# Altium footprint library lib_ic_FOOTPRINTS.PcbLib: 98 footprints (part 7 of 7)
Each footprint in its own frame and in the unit in brackets; x right, y up, seen from the top. Pads: shape width x height; smd on the part's side, far side on the other; paste and mask are expansions set on the pad; w line width, h text height; cw(c..) or ccw(c..) is an arc to the next point about the centre after c.
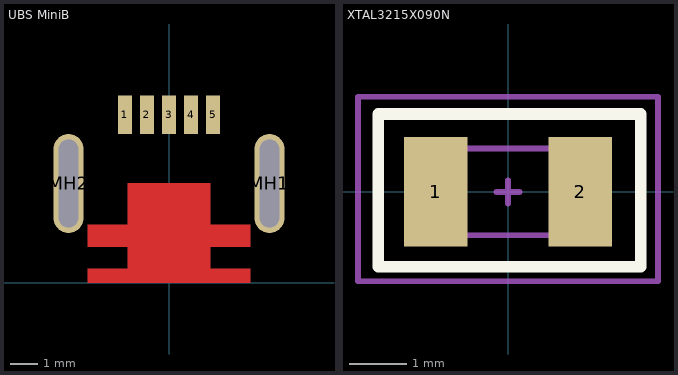
[diagram p6: the footprints below, top view; thin cyan lines are the x and y axes]

## UBS MiniB [mm]
pads (7):
  rect 0.5x1.4 smd: 1(-1.6,6.1) 2(-0.8,6.1) 3(0,6.1) 4(0.8,6.1) 5(1.6,6.1)
  rrect100% 1.1x3.6 hole 0.7 slot 3.2 at 90 deg: MH1(3.65,3.6) MH2(-3.65,3.6)
Top Layer:
  pour cut-out: -1.5,0 1.5,0 1.5,3.6 -1.5,3.6
  pour cut-out: -1.5,2.1 -2.95,2.1 -2.95,1.3 -1.5,1.3
  pour cut-out: -1.5,0.5 -2.95,0.5 -2.95,0 -1.5,0
  pour cut-out: 2.95,0.5 1.5,0.5 1.5,0 2.95,0
  pour cut-out: 2.95,2.1 1.5,2.1 1.5,1.3 2.95,1.3
3D body "WQ-1600514.stp": height 3.91, standoff -0.79, extent -3.85,-0.5 3.85,6.5

## XTAL3215X090N [mm] "Crystal, Body: 3.2mmm X 1.5mm"
height 0.9
pads (2):
  rect 1.1x1.9 smd: 1(-1.25,0) 2(1.25,0)
Top Overlay:
  lines w0.2: -2.25,-1.3 -2.25,1.35 2.3,1.35 2.3,-1.3 -2.25,-1.3
Mechanical 13:
  lines w0.1: -1.6,-0.75 1.6,-0.75 1.6,0.75 -1.6,0.75 -1.6,-0.75
Mechanical 15:
  lines w0.1: -0.2,0 0.2,0 ; 0,-0.2 0,0.2 ; -2.6,-1.55 2.6,-1.55 2.6,1.65 -2.6,1.65 -2.6,-1.55
3D body: height 0.9, standoff 0.9, extent -1.6,-0.75 1.6,0.75
3D body: height 0.9, standoff 0, extent -1.6,-0.75 1.6,0.75